# Altium footprint library Semicon-Discrete.pcblib: 205 footprints (part 10 of 13)
Each footprint in its own frame and in the unit in brackets; x right, y up, seen from the top. Pads: shape width x height; smd on the part's side, far side on the other; paste and mask are expansions set on the pad; w line width, h text height; cw(c..) or ccw(c..) is an arc to the next point about the centre after c.
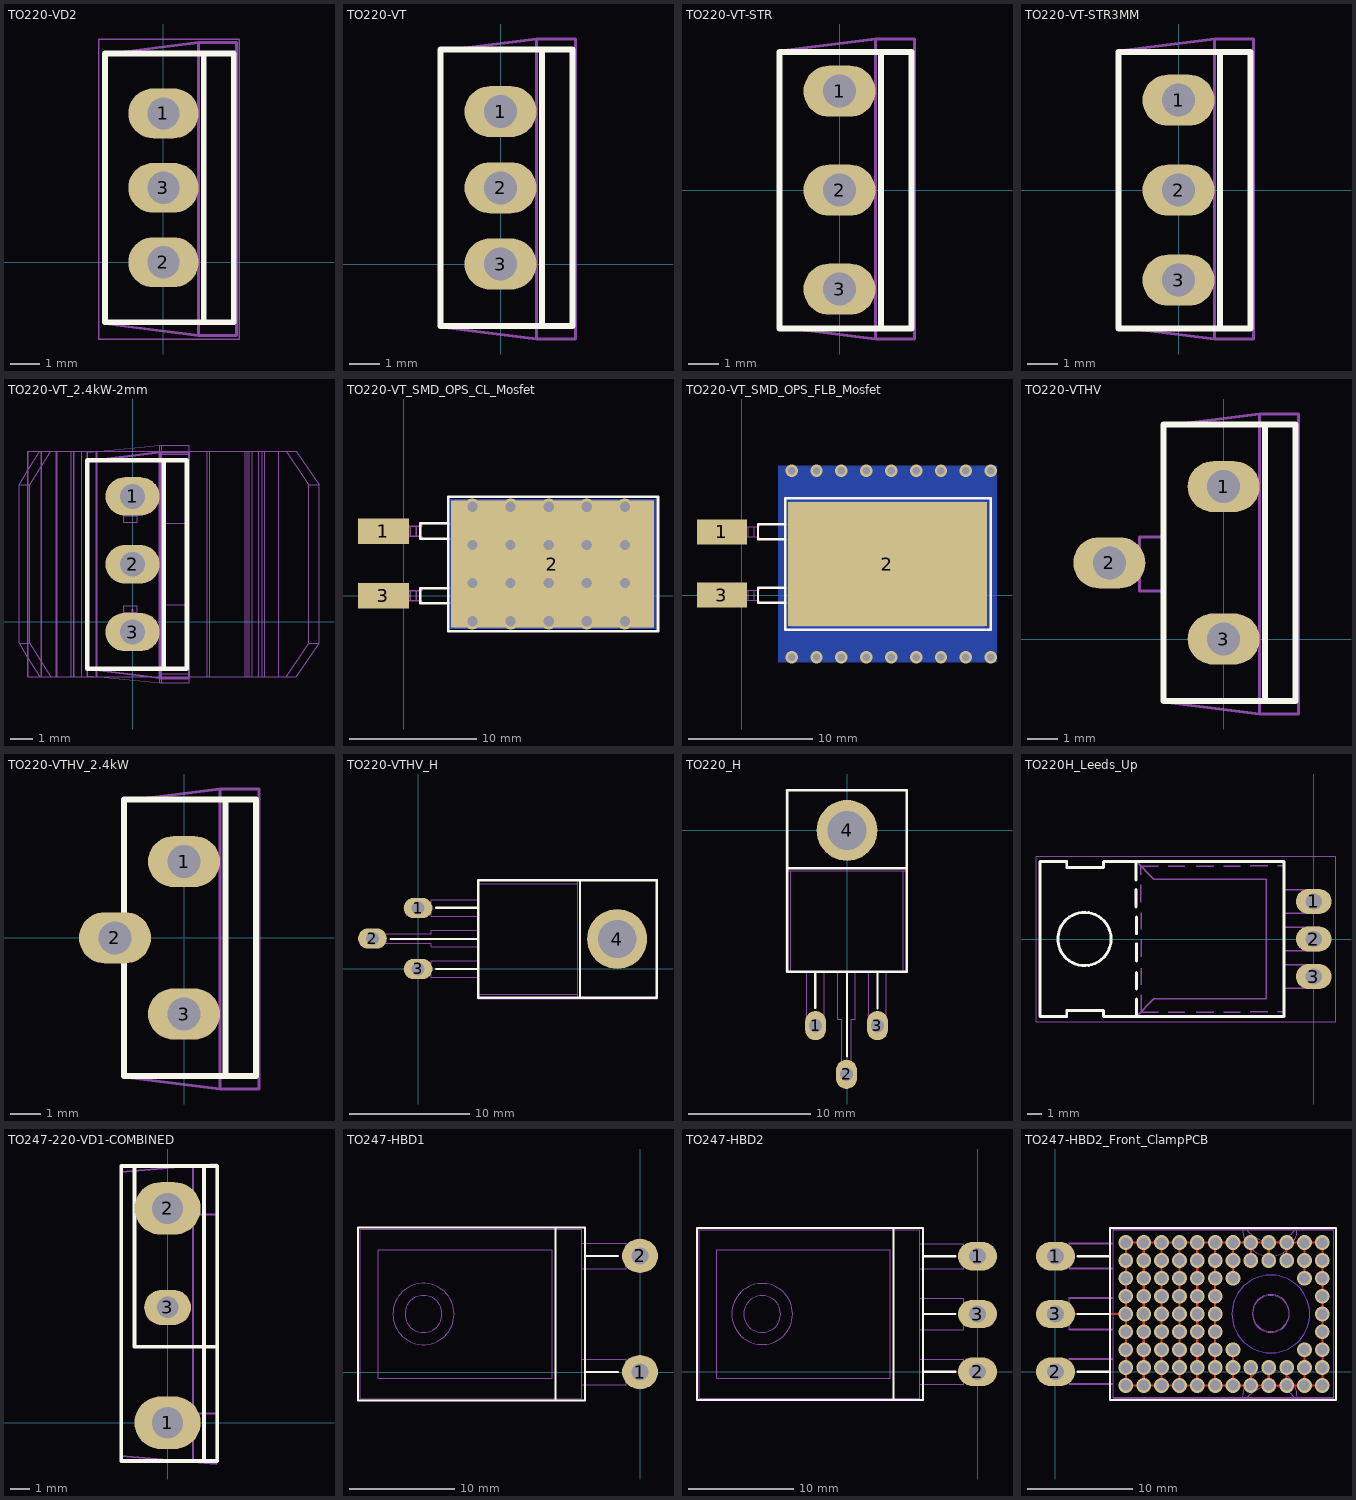
[diagram p9: the footprints below, top view; thin cyan lines are the x and y axes]

## TO220-VD2 [mm]
pads (3):
  oval 2.4x1.7 hole 1.1: 1(0,5.08) 2(0,0) 3(0,2.54)
TopOverlay:
  lines w0.2: 1.375,-2.05 1.375,7.125 ; -2,-2.05 2.4,-2.05 2.4,7.125 -2,7.125 -2,-2.05
2-TopCompOutl:
  lines w0.1: -2,2.5 -2,-2.1 1.2,-2.5 ; -2,2.5 -2,7.1 1.2,7.5 ; 1.2,-2.5 1.2,7.5 ; 1.2,-2.5 2.5,-2.5 2.5,7.5 1.2,7.5
4-TopCourty:
  circle w0.1: c0,0 r0.35
  lines w0.05: -2.2,-2.62 -2.2,7.62 2.58,7.62 2.58,-2.62 -2.2,-2.62
  lines w0.1: -0.54,0 0.54,0 ; 0,-0.56 0,0.56
7-TopAssy:
  lines w0.1: -2,2.5 -2,-2.1 1.2,-2.5 ; -2,2.5 -2,7.1 1.2,7.5 ; 1.2,-2.5 2.5,-2.5 2.5,7.5 1.2,7.5 ; 1.2,-2.5 1.2,7.5
  text ".Designator" at -2.375,-1.55 h2.2
3D body "TO220-VD2.STEP": height 22.85, standoff -3.2, extent -1.925,-2.7 2.575,7.8

## TO220-VT [mm]
pads (3):
  oval 2.4x1.7 hole 1.1: 1(0,5.08) 2(0,2.54) 3(0,0)
TopOverlay:
  lines w0.2: 1.375,-2.075 1.375,7.15 ; -2,-2.075 2.4,-2.075 2.4,7.15 -2,7.15 -2,-2.075
2-TopCompOutl:
  lines w0.1: -2,2.5 -2,-2.1 1.2,-2.5 ; -2,2.5 -2,7.1 1.2,7.5 ; 1.2,-2.5 1.2,7.5 ; 1.2,-2.5 2.5,-2.5 2.5,7.5 1.2,7.5
7-TopAssy:
  lines w0.1: -2,2.5 -2,-2.1 1.2,-2.5 ; -2,2.5 -2,7.1 1.2,7.5 ; 1.2,-2.5 1.2,7.5 ; 1.2,-2.5 2.5,-2.5 2.5,7.5 1.2,7.5
  text ".Designator" at -2.625,-1.775 h2.2
3D body "TO220-VT.STEP": height 22.85, standoff -3.2, extent -1.9,-2.7 2.6,7.8

## TO220-VT-STR [mm]
pads (3):
  oval 2.4x1.7 hole 1.1: 1(0,3.3) 2(0,0) 3(0,-3.3)
TopOverlay:
  lines w0.2: 1.375,-4.615 1.375,4.61 ; -2,-4.615 -2,4.61 2.4,4.61 2.4,-4.615 -2,-4.615
2-TopCompOutl:
  lines w0.1: -2,0.04 -2,-4.56 1.2,-4.96 ; -2,0.04 -2,4.64 1.2,5.04 ; 1.2,-4.96 2.5,-4.96 2.5,5.04 1.2,5.04 ; 1.2,-4.96 1.2,5.04
7-TopAssy:
  lines w0.1: -2,0.04 -2,-4.56 1.2,-4.96 ; -2,0.04 -2,4.64 1.2,5.04 ; 1.2,-4.96 2.5,-4.96 2.5,5.04 1.2,5.04 ; 1.2,-4.96 1.2,5.04
  text ".Designator" at -2.325,-2.975 h2.2

## TO220-VT-STR3MM [mm]
pads (3):
  oval 2.4x1.7 hole 1.1: 1(0,3) 2(0,0) 3(0,-3)
TopOverlay:
  lines w0.2: 1.375,-4.615 1.375,4.61 ; -2,-4.615 -2,4.61 2.4,4.61 2.4,-4.615 -2,-4.615
2-TopCompOutl:
  lines w0.1: -2,0.04 -2,-4.56 1.2,-4.96 ; -2,0.04 -2,4.64 1.2,5.04 ; 1.2,-4.96 2.5,-4.96 2.5,5.04 1.2,5.04 ; 1.2,-4.96 1.2,5.04
7-TopAssy:
  lines w0.1: -2,0.04 -2,-4.56 1.2,-4.96 ; -2,0.04 -2,4.64 1.2,5.04 ; 1.2,-4.96 2.5,-4.96 2.5,5.04 1.2,5.04 ; 1.2,-4.96 1.2,5.04
  text ".Designator" at -2.25,-3.325 h1.8
3D body "TO220-VT-STR3MM.STEP": height 22.85, standoff -3.2, extent -1.9,-5.2 2.6,5.3

## TO220-VT_2.4kW-2mm [mm]
height 25
pads (3):
  oval 2.4x1.7 hole 1.1: 1(0,5.54) 2(0,2.54) 3(0,-0.46)
TopOverlay:
  lines w0.2: 1.375,-2.075 1.375,7.15 ; -2,-2.075 -2,7.15 2.4,7.15 2.4,-2.075 -2,-2.075
2-TopCompOutl:
  lines w0.1: -2,2.5 -2,-2.1 1.2,-2.5 ; -2,2.5 -2,7.1 1.2,7.5 ; 1.2,-2.5 2.5,-2.5 2.5,7.5 1.2,7.5 ; 1.2,-2.5 1.2,7.5
4-TopCourty:
  lines w0.1: -0.525,0 0.525,0 ; 0,-0.525 0,0.525
5-MCadOutl:
  circle w0: c-0.1,2.55 r0.175
  lines w0: -4.626,-2.45 -4.626,7.55 ; -4.104,-2.45 -4.635,-1.588 -5.028,-0.95 ; -4.104,7.55 -4.635,6.688 -5.028,6.05 ; -4.035,-2.45 -4.035,7.55 ; -4.031,-2.45 -4.031,7.55 ; -3.632,-2.45 -4.555,-0.95 ; -3.632,7.55 -4.555,6.05 ; -3.383,-2.45 -3.383,7.55 ; -2.718,-2.45 -2.718,7.55 ; -2.595,-2.45 -2.595,7.55 ; -2.591,-2.45 -2.591,7.55 ; -2.245,-2.45 -2.245,7.55 ; -2,-2.45 -2,-2.4 ; -2,7.55 -2,7.5 ; -1.991,-2.45 -1.991,7.55 ; -1.611,-2.45 -1.611,7.55 ; -0.4,-0.39 0.2,-0.39 ; -0.4,0.41 0.2,0.41 ; -0.4,2.15 0.2,2.15 ; -0.4,2.95 0.2,2.95 ; -0.4,4.69 0.2,4.69 ; -0.4,5.49 0.2,5.49 ; 1.3,-2.3 2.5,-2.3 ; 1.3,0.75 2.5,0.75 ; 1.3,4.35 2.5,4.35 ; 1.3,7.4 2.5,7.4 ; 2.5,-1.5 2.499,-1.5 ; 2.5,6.6 2.499,6.6 ; 3.407,-2.45 3.407,7.55 ; 4.984,-2.45 4.984,7.55 ; 4.986,-2.45 4.986,7.55 ; 5.165,-2.45 5.165,7.55 ; 5.292,-2.45 5.292,7.55 ; 5.738,-2.45 5.738,7.55 ; 5.858,-2.45 5.858,7.55 ; 5.858,-2.45 5.858,7.55 ; 6.457,-2.45 6.457,7.55 ; 6.799,-2.45 7.802,-0.95 ; 6.799,7.55 7.802,6.05 ; -5.028,-0.95 -5.028,6.05 ; -5.028,-0.95 -4.555,-0.95 ; -5.028,6.05 -4.555,6.05 ; -4.555,-0.95 -4.555,6.05 ; -3.33,-2.45 -4.635,-2.45 -4.635,7.55 -3.33,7.55 ; -3.33,-2.45 -3.33,7.55 ; -3.33,-2.45 -1.558,-2.45 ; -3.33,7.55 -1.558,7.55 ; -2,-2.4 -1.467,-2.45 1.2,-2.7 ; -2,-2.4 -2,7.5 ; -2,7.5 -1.467,7.55 1.2,7.8 ; -1.558,-2.45 3.314,-2.45 ; -1.558,-2.45 -1.558,7.55 ; -1.558,7.55 3.314,7.55 ; 1.2,-2.7 1.2,-2.45 1.2,7.55 1.2,7.8 ; 1.2,-2.7 2.499,-2.7 ; 1.2,7.8 2.499,7.8 ; 2.499,-2.7 2.5,-2.7 2.5,-2.45 2.5,7.55 2.5,7.8 2.499,7.8 ; 2.499,-2.7 2.499,-2.699 ; 2.499,-2.699 1.3,-2.699 1.3,-2.45 1.3,7.55 1.3,7.799 2.499,7.799 ; 2.499,-2.699 2.499,-1.5 ; 2.499,-1.5 2.499,6.6 ; 2.499,6.6 2.499,7.799 ; 2.499,7.799 2.499,7.8 ; 3.314,-2.45 5.071,-2.45 ; 3.314,-2.45 3.314,7.55 ; 3.314,7.55 5.071,7.55 ; 5.071,-2.45 5.071,7.55 ; 5.071,-2.45 6.458,-2.45 ; 5.071,7.55 6.458,7.55 ; 6.458,-2.45 6.458,7.55 ; 6.458,-2.45 7.245,-2.45 8.248,-0.95 ; 6.458,7.55 7.245,7.55 8.248,6.05 ; 7.802,-0.95 8.248,-0.95 ; 7.802,-0.95 7.802,6.05 ; 7.802,6.05 8.248,6.05 ; 8.248,-0.95 8.248,6.05 ; -0.4,-0.69 0.2,-0.69 0.2,0.71 -0.4,0.71 -0.4,-0.69 ; -0.4,1.85 0.2,1.85 0.2,3.25 -0.4,3.25 -0.4,1.85 ; -0.4,4.39 -0.4,5.79 0.2,5.79 0.2,4.39 -0.4,4.39 ; 5.585,-2.45 5.585,7.55 5.584,-2.45
7-TopAssy:
  lines w0.1: -2,2.5 -2,-2.1 1.2,-2.5 ; -2,2.5 -2,7.1 1.2,7.5 ; 1.2,-2.5 2.5,-2.5 2.5,7.5 1.2,7.5 ; 1.2,-2.5 1.2,7.5
  text ".Designator" at -2.35,-1.175 h2.2
3D body "TO220-VT_2.4kW-2mm.STEP": height 29.68, standoff -3.2, extent -4.9,-2.7 8.376,7.8

## TO220-VT_SMD_OPS_CL_Mosfet [mm] "TO220 SMD, 4layerPCB, Mid1 used as a shield, Mid2 and Bottom connected to Earth"
pads (3):
  rect 4x2 smd: 1(-1.6,5.08) 3(-1.6,0)
  rect 16x10 smd: 2(11.7,2.5)
via 5.4,7 diameter 1.3 hole 0.8
via 8.4,7 diameter 1.3 hole 0.8
via 11.4,7 diameter 1.3 hole 0.8
via 14.4,7 diameter 1.3 hole 0.8
via 17.4,7 diameter 1.3 hole 0.8
via 17.4,4 diameter 1.3 hole 0.8
via 14.4,4 diameter 1.3 hole 0.8
via 11.4,4 diameter 1.3 hole 0.8
via 8.4,4 diameter 1.3 hole 0.8
via 5.4,4 diameter 1.3 hole 0.8
via 17.4,1 diameter 1.3 hole 0.8
via 14.4,1 diameter 1.3 hole 0.8
via 11.4,1 diameter 1.3 hole 0.8
via 8.4,1 diameter 1.3 hole 0.8
via 5.4,1 diameter 1.3 hole 0.8
via 17.4,-2 diameter 1.3 hole 0.8
via 14.4,-2 diameter 1.3 hole 0.8
via 11.4,-2 diameter 1.3 hole 0.8
via 8.4,-2 diameter 1.3 hole 0.8
via 5.4,-2 diameter 1.3 hole 0.8
MidLayer1:
  rectangle: 3.5,-2.6 19.9,7.6
MidLayer2:
  rectangle: 3.5,-2.6 19.8,7.6
BottomLayer:
  rectangle: 3.5,-2.6 19.9,7.6
TopOverlay:
  lines w0.2: 3.5,-0.6 1.3,-0.6 1.3,0.6 3.5,0.6 ; 3.5,4.5 1.3,4.5 1.3,5.7 3.5,5.7 ; 3.5,-2.8 3.5,-0.9 3.5,5.9 3.5,7.8 20,7.8 20,-2.8 3.5,-2.8
TopSolder:
  rectangle: 4,-2.6 19.5,7.5
2-TopCompOutl:
  circle w0.1: c16.5,2.54 r1.8
  lines w0.1: 0.5,-0.4 0.5,0.4 ; 0.5,4.68 0.5,5.48 ; 1,-0.4 1,0.4 ; 1,4.68 1,5.48 ; 4,-0.6 1.4,-0.6 1.4,-0.4 -1.6,-0.4 -1.6,0.4 1.4,0.4 1.4,0.6 4,0.6 ; 4,4.48 1.4,4.48 1.4,4.68 -1.6,4.68 -1.6,5.48 1.4,5.48 1.4,5.68 4,5.68 ; 13.5,-2.5 13.5,7.5 ; 4,-2.5 4,7.5 19.5,7.5 19.5,-2.5 4,-2.5
4-TopCourty:
  lines w0.1: -0.525,0 0.525,0 ; 0,-0.525 0,0.525
7-TopAssy:
  text ".Designator" at 4.65,1.675 h2.2

## TO220-VT_SMD_OPS_FLB_Mosfet [mm] "TO220 SMD, 4layerPCB, Mid1 used as a shield, Mid2 and Bottom connected to Earth"
pads (3):
  rect 4x2 smd: 1(-1.6,5.08) 3(-1.6,0)
  rect 16x10 smd: 2(11.7,2.5)
via 20,-5 diameter 1 hole 0.6
via 18,-5 diameter 1 hole 0.6
via 16,-5 diameter 1 hole 0.6
via 14,-5 diameter 1 hole 0.6
via 12,-5 diameter 1 hole 0.6
via 10,-5 diameter 1 hole 0.6
via 8,-5 diameter 1 hole 0.6
via 6,-5 diameter 1 hole 0.6
via 4,-5 diameter 1 hole 0.6
via 20,10 diameter 1 hole 0.6
via 18,10 diameter 1 hole 0.6
via 16,10 diameter 1 hole 0.6
via 14,10 diameter 1 hole 0.6
via 12,10 diameter 1 hole 0.6
via 10,10 diameter 1 hole 0.6
via 8,10 diameter 1 hole 0.6
via 6,10 diameter 1 hole 0.6
via 4,10 diameter 1 hole 0.6
MidLayer1:
  rectangle: 2.9,-5.4 20.5,10.5
MidLayer2:
  rectangle: 2.7,-2.6 19.6,7.6
BottomLayer:
  rectangle: 2.9,-5.4 20.5,10.4
TopOverlay:
  lines w0.2: 3.5,-0.6 1.3,-0.6 1.3,0.6 3.5,0.6 ; 3.5,4.5 1.3,4.5 1.3,5.7 3.5,5.7 ; 3.5,-2.8 3.5,-0.9 3.5,5.9 3.5,7.8 20,7.8 20,-2.8 3.5,-2.8
TopSolder:
  rectangle: 4,-2.6 19.5,7.5
2-TopCompOutl:
  circle w0.1: c16.5,2.54 r1.8
  lines w0.1: 0.5,-0.4 0.5,0.4 ; 0.5,4.68 0.5,5.48 ; 1,-0.4 1,0.4 ; 1,4.68 1,5.48 ; 4,-0.6 1.4,-0.6 1.4,-0.4 -1.6,-0.4 -1.6,0.4 1.4,0.4 1.4,0.6 4,0.6 ; 4,4.48 1.4,4.48 1.4,4.68 -1.6,4.68 -1.6,5.48 1.4,5.48 1.4,5.68 4,5.68 ; 13.5,-2.5 13.5,7.5 ; 4,-2.5 4,7.5 19.5,7.5 19.5,-2.5 4,-2.5
4-TopCourty:
  lines w0.1: -0.525,0 0.525,0 ; 0,-0.525 0,0.525
7-TopAssy:
  text ".Designator" at 4.425,1.75 h2.2

## TO220-VTHV [mm]
pads (3):
  oval 2.4x1.7 hole 1.1: 1(0,5.08) 2(-3.81,2.54) 3(0,0)
TopOverlay:
  lines w0.2: 1.375,-2.075 1.375,7.15 ; -2,-2.075 -2,7.15 2.4,7.15 2.4,-2.075 -2,-2.075
2-TopCompOutl:
  lines w0.1: -2,2.5 -2,-2.1 1.2,-2.5 ; -2,2.5 -2,7.1 1.2,7.5 ; 1.2,-2.5 2.5,-2.5 2.5,7.5 1.2,7.5 ; 1.2,-2.5 1.2,7.5
4-TopCourty:
  lines w0.1: -0.525,0 0.525,0 ; 0,-0.525 0,0.525
7-TopAssy:
  lines w0.1: -2,1.6 -2.8,1.6 -2.8,2.1 -3.9,2.1 -3.9,2.5 -3.9,2.9 -2.8,2.9 -2.8,3.4 -2,3.4 ; -2,2.5 -2,-2.1 1.2,-2.5 ; -2,2.5 -2,7.1 1.2,7.5 ; 1.2,-2.5 1.2,7.5 ; 1.2,-2.5 2.5,-2.5 2.5,7.5 1.2,7.5
  text ".Designator" at 0.525,0.8 h2.2

## TO220-VTHV_2.4kW [mm]
pads (3):
  oval 2.4x1.7 hole 1.1: 1(0,2.54) 2(-2.3,0) 3(0,-2.54)
TopOverlay:
  lines w0.2: 1.375,-4.615 1.375,4.61 ; -2,-4.615 -2,4.61 2.4,4.61 2.4,-4.615 -2,-4.615
2-TopCompOutl:
  lines w0.1: -2,-0.04 -2,-4.64 1.2,-5.04 ; -2,-0.04 -2,4.56 1.2,4.96 ; 1.2,-5.04 2.5,-5.04 2.5,4.96 1.2,4.96 ; 1.2,-5.04 1.2,4.96
4-TopCourty:
  lines w0.1: -0.525,-2.54 0.525,-2.54 ; 0,-3.065 0,-2.015
5-MCadOutl:
  lines w0.1: -2,-0.39 -2.325,-0.39 -2.325,0.01 -2.325,0.41 -2,0.41 ; -2,-0.04 -2,-4.64 1.2,-5.04 ; -2,-0.04 -2,4.56 1.2,4.96 ; 1.2,-5.04 1.2,4.96 ; 1.2,-5.04 2.5,-5.04 2.5,4.96 1.2,4.96
  text ".Designator" at 0.72,-2.35 h2.2
3D body "TO220-VTHV_2.4kW.STEP": height 22.85, standoff -3.2, extent -2.71,-5.24 2.596,5.26

## TO220-VTHV_H [mm]
height 5
pads (4):
  oval 2.4x1.7 hole 1.1: 1(0,5.08) 2(-3.81,2.54) 3(0,0)
  round 5 hole 3.2: 4(16.6,2.5)
TopOverlay:
  circle w0.2: c16.6,2.5 r2.3
  lines w0.2: -2.3,2.5 5,2.5 ; 1.5,0 5,0 ; 1.5,5.1 5,5.1 ; 13.5,-2.4 13.5,7.4 ; 5,-2.4 5,7.4 19.9,7.4 19.9,-2.4 5,-2.4
2-TopCompOutl:
  circle w0.1: c16.65,2.5 r1.9
  lines w0.1: 5,-2.1 13.3,-2.1 ; 5,-0.7 1.1,-0.7 1.1,-0.4 0,-0.4 0,0 0,0.4 1.1,0.4 1.1,0.7 5,0.7 ; 5,1.84 1.1,1.84 1.1,2.15 -3.8,2.15 -3.8,2.54 -3.8,2.94 1.1,2.94 1.1,3.24 5,3.24 ; 5,4.38 1.1,4.38 1.1,4.68 0,4.68 0,5.08 0,5.48 1.1,5.48 1.1,5.78 5,5.78 ; 5,7.1 13.3,7.1 ; 13.3,-2.5 13.3,7.5 ; 5,-2.5 20,-2.5 20,7.5 5,7.5 5,-2.5
4-TopCourty:
  lines w0.1: -0.525,0 0.525,0 ; 0,-0.525 0,0.525
7-TopAssy:
  circle w0.1: c16.65,2.5 r1.9
  lines w0.1: 5,-2.1 13.3,-2.1 ; 5,-0.7 1.1,-0.7 1.1,-0.4 0,-0.4 0,0 0,0.4 1.1,0.4 1.1,0.7 5,0.7 ; 5,1.84 1.1,1.84 1.1,2.15 -3.8,2.15 -3.8,2.54 -3.8,2.94 1.1,2.94 1.1,3.24 5,3.24 ; 5,4.38 1.1,4.38 1.1,4.68 0,4.68 0,5.08 0,5.48 1.1,5.48 1.1,5.78 5,5.78 ; 5,7.1 13.3,7.1 ; 13.3,-2.5 13.3,7.5 ; 5,-2.5 20,-2.5 20,7.5 5,7.5 5,-2.5
  text ".Designator" at 5.7,2.05 h2.2

## TO220_H [mm]
height 5
pads (4):
  oval 1.7x2.4 hole 1.1: 1(-2.58,-16) 2(-0.04,-20) 3(2.5,-16)
  round 5 hole 3.2: 4(0,0)
TopOverlay:
  lines w0.2: -4.9,-3.1 4.9,-3.1 ; -2.6,-14.554 -2.6,-11.6 ; 0,-18.517 0,-11.6 ; 2.5,-14.58 2.5,-11.6 ; -4.9,-11.6 -4.9,3.3 4.9,3.3 4.9,-11.6 -4.9,-11.6
2-TopCompOutl:
  circle w0.1: c0,0.05 r1.9
  lines w0.1: -5,-3.3 5,-3.3 ; -4.6,-11.6 -4.6,-3.3 ; -3.28,-11.6 -3.28,-15.5 -2.98,-15.5 -2.98,-16.6 -2.58,-16.6 -2.18,-16.6 -2.18,-15.5 -1.88,-15.5 -1.88,-11.6 ; -0.74,-11.6 -0.74,-15.5 -0.44,-15.5 -0.44,-20.4 -0.04,-20.4 0.35,-20.4 0.35,-15.5 0.66,-15.5 0.66,-11.6 ; 1.8,-11.6 1.8,-15.5 2.1,-15.5 2.1,-16.6 2.5,-16.6 2.9,-16.6 2.9,-15.5 3.2,-15.5 3.2,-11.6 ; 4.6,-11.6 4.6,-3.3 ; -5,-11.6 5,-11.6 5,3.4 -5,3.4 -5,-11.6
4-TopCourty:
  lines w0.1: -0.525,0 0.525,0 ; 0,-0.525 0,0.525
7-TopAssy:
  circle w0.1: c0,0.05 r1.9
  lines w0.1: -5,-3.3 5,-3.3 ; -4.6,-11.6 -4.6,-3.3 ; -3.28,-11.6 -3.28,-15.5 -2.98,-15.5 -2.98,-16.6 -2.58,-16.6 -2.18,-16.6 -2.18,-15.5 -1.88,-15.5 -1.88,-11.6 ; -0.74,-11.6 -0.74,-15.5 -0.44,-15.5 -0.44,-20.4 -0.04,-20.4 0.35,-20.4 0.35,-15.5 0.66,-15.5 0.66,-11.6 ; 1.8,-11.6 1.8,-15.5 2.1,-15.5 2.1,-16.6 2.5,-16.6 2.9,-16.6 2.9,-15.5 3.2,-15.5 3.2,-11.6 ; 4.6,-11.6 4.6,-3.3 ; -5,-11.6 -5,3.4 5,3.4 5,-11.6 -5,-11.6
  text ".Designator" at -3.3,-8.35 h2.2

## TO220H_Leeds_Up [mm]
height 5
pads (3):
  oval 2.4x1.7 hole 1.1: 1(0,2.54) 2(0,0) 3(0,-2.54)
TopOverlay:
  circle w0.2: c-15.5,0 r1.8
  lines w0.2: -12.021,3.98 -12.021,5.23 ; -12.016,2.176 -12.016,3.355 ; -11.996,-3.395 -11.996,-2.27 ; -11.996,0.355 -11.996,1.48 ; -11.991,-5.249 -11.991,-4.07 ; -11.991,-1.499 -11.991,-0.32 ; -18.5,-5.25 -16.7,-5.25 -16.7,-4.85 -14.2,-4.85 -14.2,-5.25 -2,-5.25 -2,5.25 -14.2,5.25 -14.2,4.85 -16.7,4.85 -16.7,5.25 -18.5,5.25 -18.5,-5.25
2-TopCompOutl:
  circle w0.1: c-15.5,0 r1.8
  circle w0.1: c0,0 r0.36
  circle w0.1: c0,-2.54 r0.36
  circle w0.1: c0,2.54 r0.36
  lines w0.1: -18.5,-5.249 -16.7,-5.249 ; -18.5,5.249 -16.7,5.249 ; -14.2,-5.249 -12,-5.249 -12,-5.25 ; -14.2,5.249 -12,5.249 -12,5.25 ; -12.021,3.98 -12.021,5.23 ; -12.016,2.176 -12.016,3.355 ; -11.996,-3.395 -11.996,-2.27 ; -11.996,0.355 -11.996,1.48 ; -11.991,-5.249 -11.991,-4.07 ; -11.991,-1.499 -11.991,-0.32 ; -11.7,-4.95 -10.521,-4.95 ; -11.7,4.925 -10.521,4.925 ; -11.696,4.33 -11.696,4.905 ; -11.691,2.476 -11.691,3.655 ; -11.671,-3.095 -11.671,-1.97 ; -11.671,0.655 -11.671,1.78 ; -11.666,-4.949 -11.666,-3.77 ; -11.666,-1.199 -11.666,-0.02 ; -9.846,-4.945 -8.721,-4.945 ; -9.846,4.93 -8.721,4.93 ; -7.95,-4.95 -6.771,-4.95 ; -7.95,4.925 -6.771,4.925 ; -6.096,-4.945 -4.971,-4.945 ; -6.096,4.93 -4.971,4.93 ; -4.275,-4.925 -3.096,-4.925 ; -4.275,4.95 -3.096,4.95 ; -2.421,-4.92 -2.021,-4.92 ; -2.421,4.955 -2.021,4.955 ; -2,-3.34 -0.7,-3.34 0.4,-3.34 0.4,-1.74 -0.7,-1.74 -2,-1.74 ; -2,-0.8 -0.7,-0.8 0.4,-0.8 0.4,0.8 -0.7,0.8 -2,0.8 ; -2,1.74 -0.7,1.74 0.4,1.74 0.4,3.34 -0.7,3.34 -2,3.34 ; -0.4,-3.34 -0.4,-1.74 ; -0.4,-2.93 0.4,-2.93 ; -0.4,-2.15 0.4,-2.15 ; -0.4,-0.8 -0.4,0.8 ; -0.4,-0.39 0.4,-0.39 ; -0.4,0.39 0.4,0.39 ; -0.4,1.74 -0.4,3.34 ; -0.4,2.15 0.4,2.15 ; -0.4,2.93 0.4,2.93 ; -12,-5.25 -2,-5.25 -2,5.25 -12,5.25 ; -12,-5.25 -10.8,-4.05 -3.2,-4.05 -3.2,4.05 -10.8,4.05 -12,5.25 ; -12,-5.25 -14.2,-5.25 -14.2,-4.85 -16.7,-4.85 -16.7,-5.25 -18.5,-5.25 -18.5,5.25 -16.7,5.25 -16.7,4.85 -14.2,4.85 -14.2,5.25 -12,5.25
4-TopCourty:
  lines w0.05: -18.78,-5.6 1.51,-5.6 1.51,5.6 -18.78,5.6 -18.78,-5.6
7-TopAssy:
  circle w0.1: c-15.5,0 r1.8
  lines w0.1: -18.5,-5.249 -16.7,-5.249 ; -18.5,5.249 -16.7,5.249 ; -14.2,-5.249 -12,-5.249 -12,-5.25 ; -14.2,5.249 -12,5.249 -12,5.25 ; -12.021,3.98 -12.021,5.23 ; -12.016,2.176 -12.016,3.355 ; -11.996,-3.395 -11.996,-2.27 ; -11.996,0.355 -11.996,1.48 ; -11.991,-5.249 -11.991,-4.07 ; -11.991,-1.499 -11.991,-0.32 ; -11.7,-4.95 -10.521,-4.95 ; -11.7,4.925 -10.521,4.925 ; -11.696,4.33 -11.696,4.905 ; -11.691,2.476 -11.691,3.655 ; -11.671,-3.095 -11.671,-1.97 ; -11.671,0.655 -11.671,1.78 ; -11.666,-4.949 -11.666,-3.77 ; -11.666,-1.199 -11.666,-0.02 ; -9.846,-4.945 -8.721,-4.945 ; -9.846,4.93 -8.721,4.93 ; -7.95,-4.95 -6.771,-4.95 ; -7.95,4.925 -6.771,4.925 ; -6.096,-4.945 -4.971,-4.945 ; -6.096,4.93 -4.971,4.93 ; -4.275,-4.925 -3.096,-4.925 ; -4.275,4.95 -3.096,4.95 ; -2.421,-4.92 -2.021,-4.92 ; -2.421,4.955 -2.021,4.955 ; -2,-4.56 -2,0.04 ; -2,-3.34 -0.4,-3.34 ; -2,-1.74 -0.4,-1.74 ; -2,-0.8 -0.4,-0.8 ; -2,0.04 -2,4.64 ; -2,0.8 -0.4,0.8 ; -2,1.74 -0.4,1.74 ; -2,3.34 -0.4,3.34 ; -0.4,-2.93 0.4,-2.93 0.4,-2.15 -0.4,-2.15 ; -0.4,-0.39 0.4,-0.39 0.4,0.39 -0.4,0.39 ; -0.4,2.15 0.4,2.15 0.4,2.93 -0.4,2.93 ; -12,-5.25 -14.2,-5.25 -14.2,-4.85 -16.7,-4.85 -16.7,-5.25 -18.5,-5.25 -18.5,5.25 -16.7,5.25 -16.7,4.85 -14.2,4.85 -14.2,5.25 -12,5.25 ; -12,-5.25 -10.8,-4.05 -3.2,-4.05 -3.2,4.05 -10.8,4.05 -12,5.25 ; -12,-5.25 -2,-5.25 -2,5.25 -12,5.25 ; -0.4,-3.34 -0.4,-1.74 ; -0.4,-3.34 -0.4,-1.74 ; -0.4,-0.8 -0.4,0.8 ; -0.4,-0.8 -0.4,0.8 ; -0.4,1.74 -0.4,3.34 ; -0.4,1.74 -0.4,3.34
  text ".Designator" at -10.325,-0.65 h2.2
3D body "To220V_Lu.STEP": height 4.5, standoff -2.55, extent -18.5,-5.25 0.4,5.25

## TO247-220-VD1-COMBINED [mm]
pads (3):
  oval 3.4x2.7 hole 1.6: 1(0,0) 2(0,11)
  oval 2.4x1.8 hole 1.1: 3(0,5.92)
TopOverlay:
  lines w0.2: -1.7,13.175 -1.7,3.9 2.55,3.9 ; 1.875,13.175 1.875,-1.975 1.9,-1.975 ; -2.375,-1.975 2.55,-1.975 2.55,13.175 -2.375,13.175 -2.375,-1.975
2-TopCompOutl:
  lines w0.1: -2.4,5.58 -2.4,12.88 2.5,13.28 2.5,-2.12 -2.4,-1.72 -2.4,5.68 ; 1.3,-1.92 1.3,13.18 ; 1.3,0.48 2.5,0.48 ; 1.3,10.68 2.5,10.68
4-TopCourty:
  lines w0.1: -0.525,0 0.525,0 ; 0,-0.525 0,0.525
7-TopAssy:
  text ".Designator" at 0.425,2.025 h2.2

## TO247-HBD1 [mm] "TO247 Horisontaly Mounted - Single Diode"
height 5
pads (2):
  oval 3.4x3.2 hole 1.6: 1(0,0) 2(0,11)
TopOverlay:
  lines w0.2: -8,-2.7 -8,13.7 ; -5.2,0 -2.1,0 ; -5.2,11 -2.1,11 ; -26.7,-2.7 -26.7,13.7 -5.2,13.7 -5.2,5.5 -5.2,-2.7 -26.7,-2.7
2-TopCompOutl:
  circle w0.1: c-20.5,5.5 r1.75
  lines w0.1: -5.5,-1.2 -1.3,-1.2 -1.3,-0.6 0,-0.6 0,0 0,0.6 -1.3,0.6 -1.3,1.2 -5.5,1.2 ; -5.5,9.8 -1.3,9.8 -1.3,10.4 0,10.4 0,11 0,11.6 -1.3,11.6 -1.3,12.2 -5.5,12.2 ; -26.5,-2.5 -26.5,13.5 -5.5,13.5 -5.5,-2.5 -26.5,-2.5
4-TopCourty:
  lines w0.1: -0.525,0 0.525,0 ; 0,-0.525 0,0.525
7-TopAssy:
  circle w0.1: c-20.5,5.5 r1.75
  circle w0.1: c-20.5,5.5 r2.9
  lines w0.1: -5.5,-1.2 -1.3,-1.2 -1.3,-0.6 0,-0.6 0,0 0,0.6 -1.3,0.6 -1.3,1.2 -5.5,1.2 ; -5.5,9.8 -1.3,9.8 -1.3,10.4 0,10.4 0,11 0,11.6 -1.3,11.6 -1.3,12.2 -5.5,12.2 ; -26.5,-2.5 -5.5,-2.5 -5.5,13.5 -26.5,13.5 -26.5,-2.5 ; -24.8,-0.6 -8.3,-0.6 -8.3,5.5 -8.3,11.6 -24.8,11.6 -24.8,5.5 -24.8,-0.6
  text ".Designator" at -16.625,4.925 h2.2

## TO247-HBD2 [mm] "TO247 Horisontaly Mounted - Double Diode"
height 5
pads (3):
  oval 3.7x2.7 hole 1.6: 1(0,11) 2(0,0) 3(0,5.5)
TopOverlay:
  lines w0.2: -8,-2.7 -8,13.7 ; -5.2,0 -2.1,0 ; -5.2,11 -2.1,11 ; -2.1,5.5 -5.2,5.5 ; -5.2,5.5 -5.2,13.7 -26.7,13.7 -26.7,-2.7 -5.2,-2.7 -5.2,5.5
2-TopCompOutl:
  circle w0.1: c-20.5,5.5 r1.75
  lines w0.1: -5.5,-1.2 -1.3,-1.2 -1.3,-0.6 0,-0.6 0,0 0,0.6 -1.3,0.6 -1.3,1.2 -5.5,1.2 ; -5.5,4 -1.3,4 -1.3,4.9 0,4.9 0,5.5 0,6.1 -1.3,6.1 -1.3,7 -5.5,7 ; -5.5,9.8 -1.3,9.8 -1.3,10.4 0,10.4 0,11 0,11.6 -1.3,11.6 -1.3,12.2 -5.5,12.2 ; -26.5,-2.5 -26.5,13.5 -5.5,13.5 -5.5,-2.5 -26.5,-2.5
4-TopCourty:
  lines w0.1: -0.525,0 0.525,0 ; 0,-0.525 0,0.525
7-TopAssy:
  circle w0.1: c-20.5,5.5 r2.9
  circle w0.1: c-20.5,5.5 r1.75
  lines w0.1: -5.5,-1.2 -1.3,-1.2 -1.3,-0.6 0,-0.6 0,0 0,0.6 -1.3,0.6 -1.3,1.2 -5.5,1.2 ; -5.5,4 -1.3,4 -1.3,4.9 0,4.9 0,5.5 0,6.1 -1.3,6.1 -1.3,7 -5.5,7 ; -5.5,9.8 -1.3,9.8 -1.3,10.4 0,10.4 0,11 0,11.6 -1.3,11.6 -1.3,12.2 -5.5,12.2 ; -26.5,-2.5 -26.5,13.5 -5.5,13.5 -5.5,-2.5 -26.5,-2.5 ; -24.8,-0.6 -24.8,5.5 -24.8,11.6 -8.3,11.6 -8.3,5.5 -8.3,-0.6 -24.8,-0.6
  text ".Designator" at -1.75,1.025 h2.2

## TO247-HBD2_Front_ClampPCB [mm]
height 5
pads (3):
  oval 3.7x2.7 hole 1.6: 1(0,11) 2(0,0) 3(0,5.5)
via 25.4,5.5 diameter 1.4 hole 1
via 25.4,3.8 diameter 1.4 hole 1
via 6.7,3.8 diameter 1.4 hole 1
via 8.4,3.8 diameter 1.4 hole 1
via 10.1,3.8 diameter 1.4 hole 1
via 11.8,3.8 diameter 1.4 hole 1
via 13.5,3.8 diameter 1.4 hole 1
via 15.2,3.8 diameter 1.4 hole 1
via 25.4,2.1 diameter 1.4 hole 1
via 23.7,2.1 diameter 1.4 hole 1
via 6.7,2.1 diameter 1.4 hole 1
via 8.4,2.1 diameter 1.4 hole 1
via 10.1,2.1 diameter 1.4 hole 1
via 11.8,2.1 diameter 1.4 hole 1
via 13.5,2.1 diameter 1.4 hole 1
via 15.2,2.1 diameter 1.4 hole 1
via 16.9,2.1 diameter 1.4 hole 1
via 25.4,0.4 diameter 1.4 hole 1
via 23.7,0.4 diameter 1.4 hole 1
via 6.7,0.4 diameter 1.4 hole 1
via 8.4,0.4 diameter 1.4 hole 1
via 10.1,0.4 diameter 1.4 hole 1
via 11.8,0.4 diameter 1.4 hole 1
via 13.5,0.4 diameter 1.4 hole 1
via 15.2,0.4 diameter 1.4 hole 1
via 16.9,0.4 diameter 1.4 hole 1
via 18.6,0.4 diameter 1.4 hole 1
via 20.3,0.4 diameter 1.4 hole 1
via 22,0.4 diameter 1.4 hole 1
via 25.4,-1.3 diameter 1.4 hole 1
via 23.7,-1.3 diameter 1.4 hole 1
via 6.7,-1.3 diameter 1.4 hole 1
via 8.4,-1.3 diameter 1.4 hole 1
via 10.1,-1.3 diameter 1.4 hole 1
via 11.8,-1.3 diameter 1.4 hole 1
via 13.5,-1.3 diameter 1.4 hole 1
via 15.2,-1.3 diameter 1.4 hole 1
via 16.9,-1.3 diameter 1.4 hole 1
via 18.6,-1.3 diameter 1.4 hole 1
via 20.3,-1.3 diameter 1.4 hole 1
via 22,-1.3 diameter 1.4 hole 1
via 25.4,12.3 diameter 1.4 hole 1
via 23.7,12.3 diameter 1.4 hole 1
via 6.7,12.3 diameter 1.4 hole 1
via 8.4,12.3 diameter 1.4 hole 1
via 10.1,12.3 diameter 1.4 hole 1
via 11.8,12.3 diameter 1.4 hole 1
via 13.5,12.3 diameter 1.4 hole 1
via 15.2,12.3 diameter 1.4 hole 1
via 16.9,12.3 diameter 1.4 hole 1
via 18.6,12.3 diameter 1.4 hole 1
via 20.3,12.3 diameter 1.4 hole 1
via 22,12.3 diameter 1.4 hole 1
via 25.4,10.6 diameter 1.4 hole 1
via 23.7,10.6 diameter 1.4 hole 1
via 6.7,10.6 diameter 1.4 hole 1
via 8.4,10.6 diameter 1.4 hole 1
via 10.1,10.6 diameter 1.4 hole 1
via 11.8,10.6 diameter 1.4 hole 1
via 13.5,10.6 diameter 1.4 hole 1
via 15.2,10.6 diameter 1.4 hole 1
via 16.9,10.6 diameter 1.4 hole 1
via 18.6,10.6 diameter 1.4 hole 1
via 20.3,10.6 diameter 1.4 hole 1
via 22,10.6 diameter 1.4 hole 1
via 25.4,8.9 diameter 1.4 hole 1
via 23.7,8.9 diameter 1.4 hole 1
via 6.7,8.9 diameter 1.4 hole 1
via 8.4,8.9 diameter 1.4 hole 1
via 10.1,8.9 diameter 1.4 hole 1
via 11.8,8.9 diameter 1.4 hole 1
via 13.5,8.9 diameter 1.4 hole 1
via 15.2,8.9 diameter 1.4 hole 1
via 16.9,8.9 diameter 1.4 hole 1
via 25.4,7.2 diameter 1.4 hole 1
via 6.7,7.2 diameter 1.4 hole 1
via 8.4,7.2 diameter 1.4 hole 1
via 10.1,7.2 diameter 1.4 hole 1
via 11.8,7.2 diameter 1.4 hole 1
via 13.5,7.2 diameter 1.4 hole 1
via 15.2,7.2 diameter 1.4 hole 1
via 6.7,5.5 diameter 1.4 hole 1
via 8.4,5.5 diameter 1.4 hole 1
via 10.1,5.5 diameter 1.4 hole 1
via 11.8,5.5 diameter 1.4 hole 1
via 13.5,5.5 diameter 1.4 hole 1
via 15.2,5.5 diameter 1.4 hole 1
TopLayer:
  lines w0.2: 0,5.5 6.7,5.5 ; 8.4,-1.3 8.4,12.3 ; 10.1,-1.3 10.1,12.3 ; 11.8,-1.3 11.8,12.3 ; 13.5,-1.3 13.5,12.3 ; 15.2,-1.3 15.2,12.3 ; 16.9,-1.3 16.9,2.1 ; 16.9,8.9 16.9,12.3 ; 18.6,-1.3 18.6,0.4 ; 18.6,10.6 18.6,12.3 ; 20.3,-1.3 20.3,0.4 ; 20.3,10.6 20.3,12.3 ; 22,-1.3 22,0.4 ; 22,10.6 22,12.3 ; 23.7,-1.3 23.7,2.1 ; 23.7,8.9 23.7,12.3 ; 6.7,-1.3 25.4,-1.3 25.4,12.3 6.7,12.3 6.7,-1.3
TopLayer keep-out:
  circle w0.1: c20.5,5.5 r3.7
BottomLayer keep-out:
  circle w0.1: c20.5,5.5 r3.7
TopOverlay:
  lines w0.2: 2.1,0 5.2,0 ; 2.1,5.5 5.2,5.5 ; 2.1,11 5.2,11 ; 5.2,5.5 5.2,-2.7 26.7,-2.7 26.7,13.7 5.2,13.7 5.2,5.5
TopSolder:
  region: 26.5,13.5 5.5,13.5 5.5,-2.5 26.5,-2.5
2-TopCompOutl:
  circle w0.1: c20.5,5.5 r1.75
  lines w0.1: 5.5,-1.2 1.3,-1.2 1.3,-0.6 0,-0.6 0,0 0,0.6 1.3,0.6 1.3,1.2 5.5,1.2 ; 5.5,4 1.3,4 1.3,4.9 0,4.9 0,5.5 0,6.1 1.3,6.1 1.3,7 5.5,7 ; 5.5,9.8 1.3,9.8 1.3,10.4 0,10.4 0,11 0,11.6 1.3,11.6 1.3,12.2 5.5,12.2 ; 18.2,-2.5 cw(c20.5,-4.3) 22.836,-2.548 ; 18.2,13.5 ccw(c20.5,15.3) 22.836,13.548 ; 5.5,-2.5 26.5,-2.5 26.5,13.5 5.5,13.5 5.5,-2.5
4-TopCourty:
  lines w0.1: -0.525,0 0.525,0 ; 0,-0.525 0,0.525
7-TopAssy:
  circle w0.1: c20.5,5.6 r1.75
  lines w0.1: 5.5,-1.1 1.3,-1.1 1.3,-0.5 0,-0.5 0,0.1 0,0.7 1.3,0.7 1.3,1.3 5.5,1.3 ; 5.5,4.1 1.3,4.1 1.3,5 0,5 0,5.6 0,6.2 1.3,6.2 1.3,7.1 5.5,7.1 ; 5.5,9.9 1.3,9.9 1.3,10.5 0,10.5 0,11.1 0,11.7 1.3,11.7 1.3,12.3 5.5,12.3 ; 17.8,-2.4 cw(c20.4,-2.4) 23,-2.4 ; 17.8,13.6 ccw(c20.4,13.6) 23,13.6 ; 5.5,-2.4 26.5,-2.4 26.5,13.6 5.5,13.6 5.5,-2.4
  text ".Designator" at 6.75,3.925 h2.2